# Altium integrated library EFR_Lib.IntLib: 430 symbols (part 6 of 6)
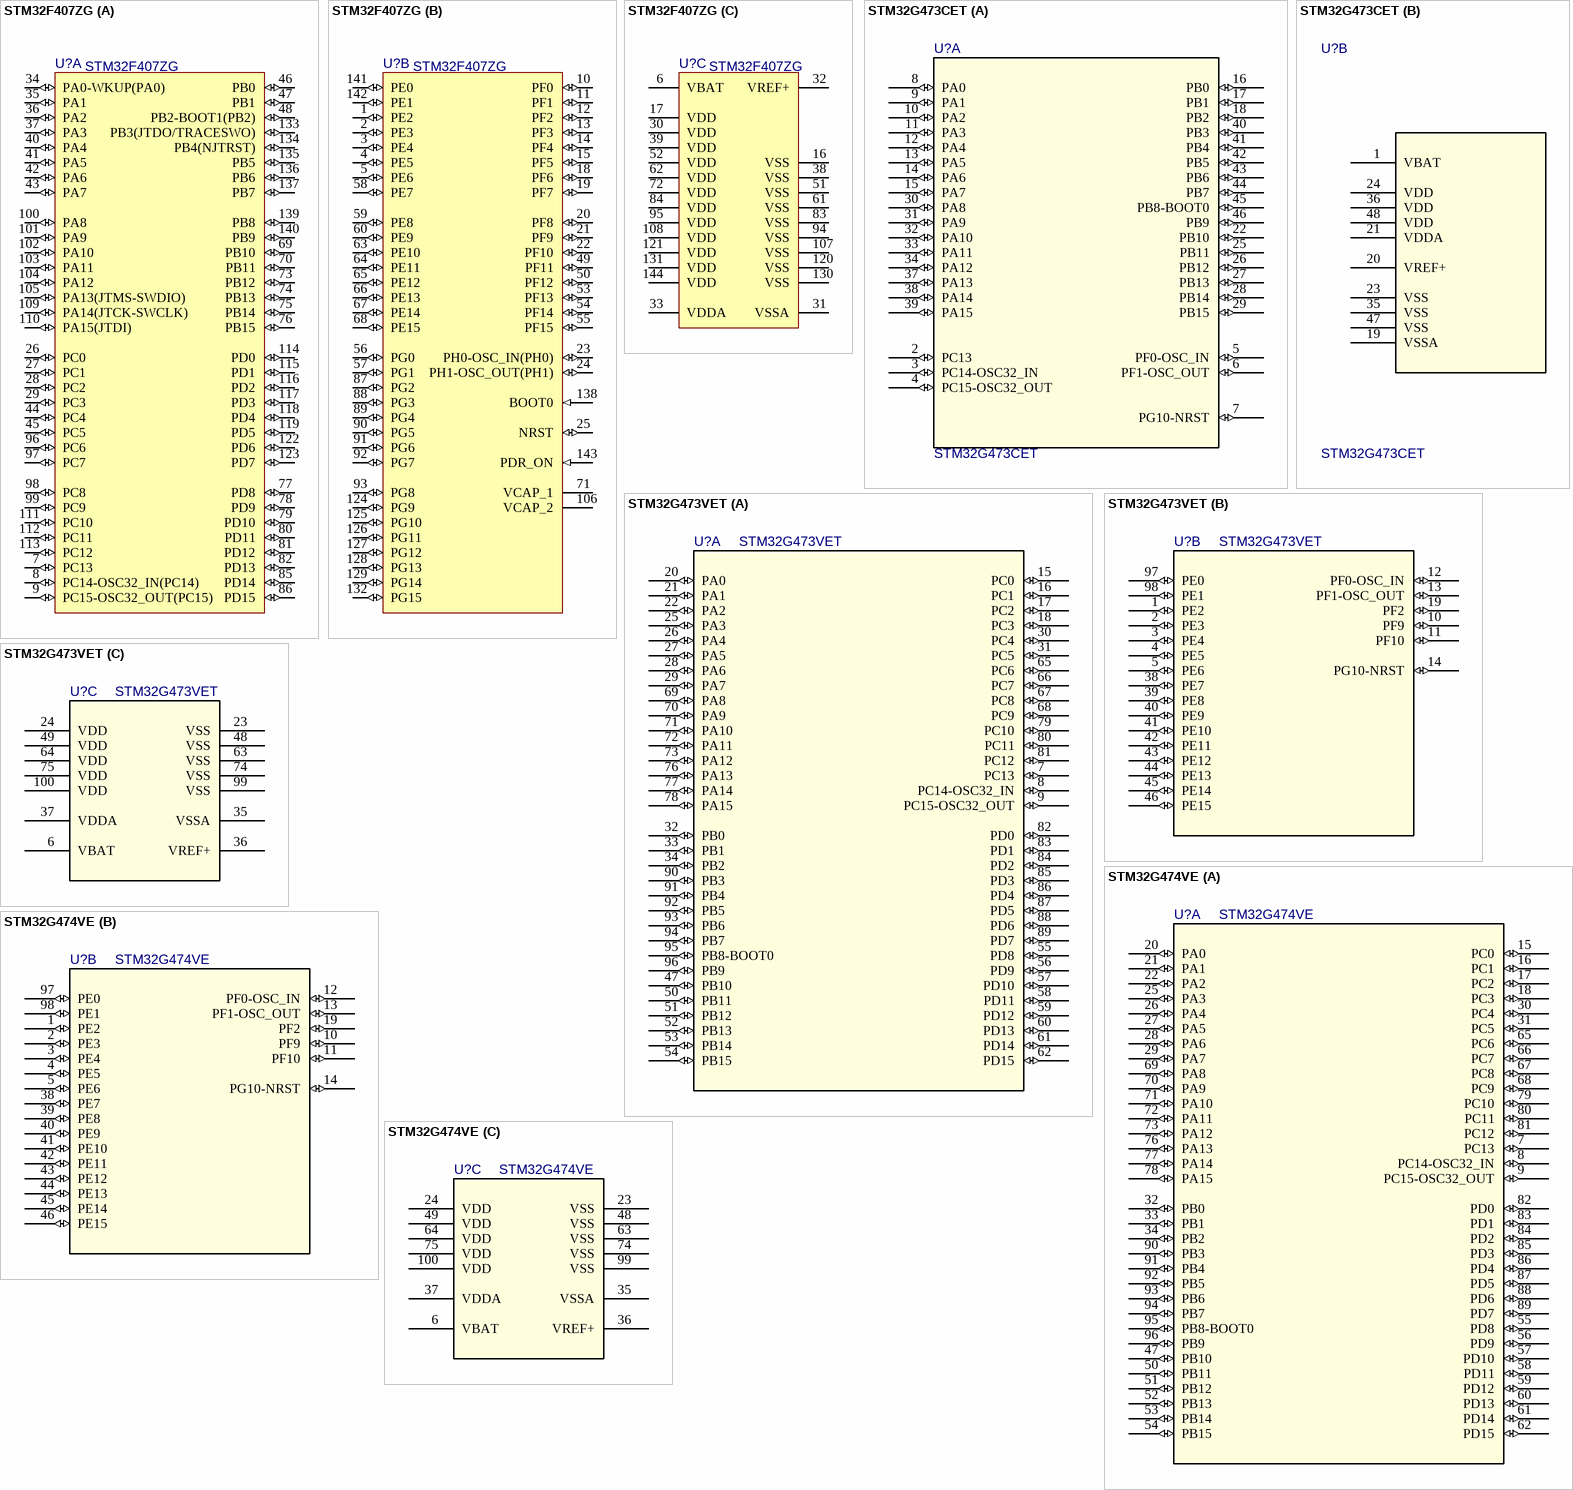
[diagram p34: symbols STM32F407ZG to STM32G474VE]

## STM32G474VE
designator U?
Microcontroller 32-Bit ARM Cortex-M4 RISC 512KB Flash 1.71V to 3.6V 100-Pin LQFP; Manufacturer: STMicroelectronics; Built_By: EMA_UL_Team; SourceLibrary: Updates_to_database_2020-10-19; PartNumber: STM32G474VE; Copyright: Copyright (C) 2018 Accelerated Designs. All rights reserved; RefDes: RefDes; Type: MCU; RoHS: No; Category: Microcontrollers; ComponentLink1Description: Manufacturer; ComponentLink1URL: https://www.st.com/content/st_com/en/products/microcontrollers-microprocessors/stm32-32-bit-arm-cortex-mcus/stm32-mainstream-mcus/stm32g4-series/stm32g4x4/stm32g474ve.html; ComponentLink2Description: Datasheet; ComponentLink2URL: https://www.st.com/resource/en/datasheet/stm32g474ve.pdf; ComponentLink3Description: Reference Manual; ComponentLink3URL: https://www.st.com/resource/en/reference_manual/dm00355726-stm32g4-series-advanced-armbased-32bit-mcus-stmicroelectronics.pdf
footprint LQFP100_L
footprint LQFP100_N
part A pins: 7 PC13 (io), 8 PC14-OSC32_IN (io), 9 PC15-OSC32_OUT (io), 15 PC0 (io), 16 PC1 (io), 17 PC2 (io), 18 PC3 (io), 20 PA0 (io), 21 PA1 (io), 22 PA2 (io), 25 PA3 (io), 26 PA4 (io), 27 PA5 (io), 28 PA6 (io), 29 PA7 (io), 30 PC4 (io), 31 PC5 (io), 32 PB0 (io), 33 PB1 (io), 34 PB2 (io), 47 PB10 (io), 50 PB11 (io), 51 PB12 (io), 52 PB13 (io), 53 PB14 (io), 54 PB15 (io), 55 PD8 (io), 56 PD9 (io), 57 PD10 (io), 58 PD11 (io), 59 PD12 (io), 60 PD13 (io), 61 PD14 (io), 62 PD15 (io), 65 PC6 (io), 66 PC7 (io), 67 PC8 (io), 68 PC9 (io), 69 PA8 (io), 70 PA9 (io), 71 PA10 (io), 72 PA11 (io), 73 PA12 (io), 76 PA13 (io), 77 PA14 (io), 78 PA15 (io), 79 PC10 (io), 80 PC11 (io), 81 PC12 (io), 82 PD0 (io), 83 PD1 (io), 84 PD2 (io), 85 PD3 (io), 86 PD4 (io), 87 PD5 (io), 88 PD6 (io), 89 PD7 (io), 90 PB3 (io), 91 PB4 (io), 92 PB5 (io), 93 PB6 (io), 94 PB7 (io), 95 PB8-BOOT0 (io), 96 PB9 (io)
part B pins: 1 PE2 (io), 2 PE3 (io), 3 PE4 (io), 4 PE5 (io), 5 PE6 (io), 10 PF9 (io), 11 PF10 (io), 12 PF0-OSC_IN (io), 13 PF1-OSC_OUT (io), 14 PG10-NRST (io), 19 PF2 (io), 38 PE7 (io), 39 PE8 (io), 40 PE9 (io), 41 PE10 (io), 42 PE11 (io), 43 PE12 (io), 44 PE13 (io), 45 PE14 (io), 46 PE15 (io), 97 PE0 (io), 98 PE1 (io)
part C pins: 6 VBAT (power), 23 VSS (power), 24 VDD (power), 35 VSSA (power), 36 VREF+ (power), 37 VDDA (power), 48 VSS (power), 49 VDD (power), 63 VSS (power), 64 VDD (power), 74 VSS (power), 75 VDD (power), 99 VSS (power), 100 VDD (power)

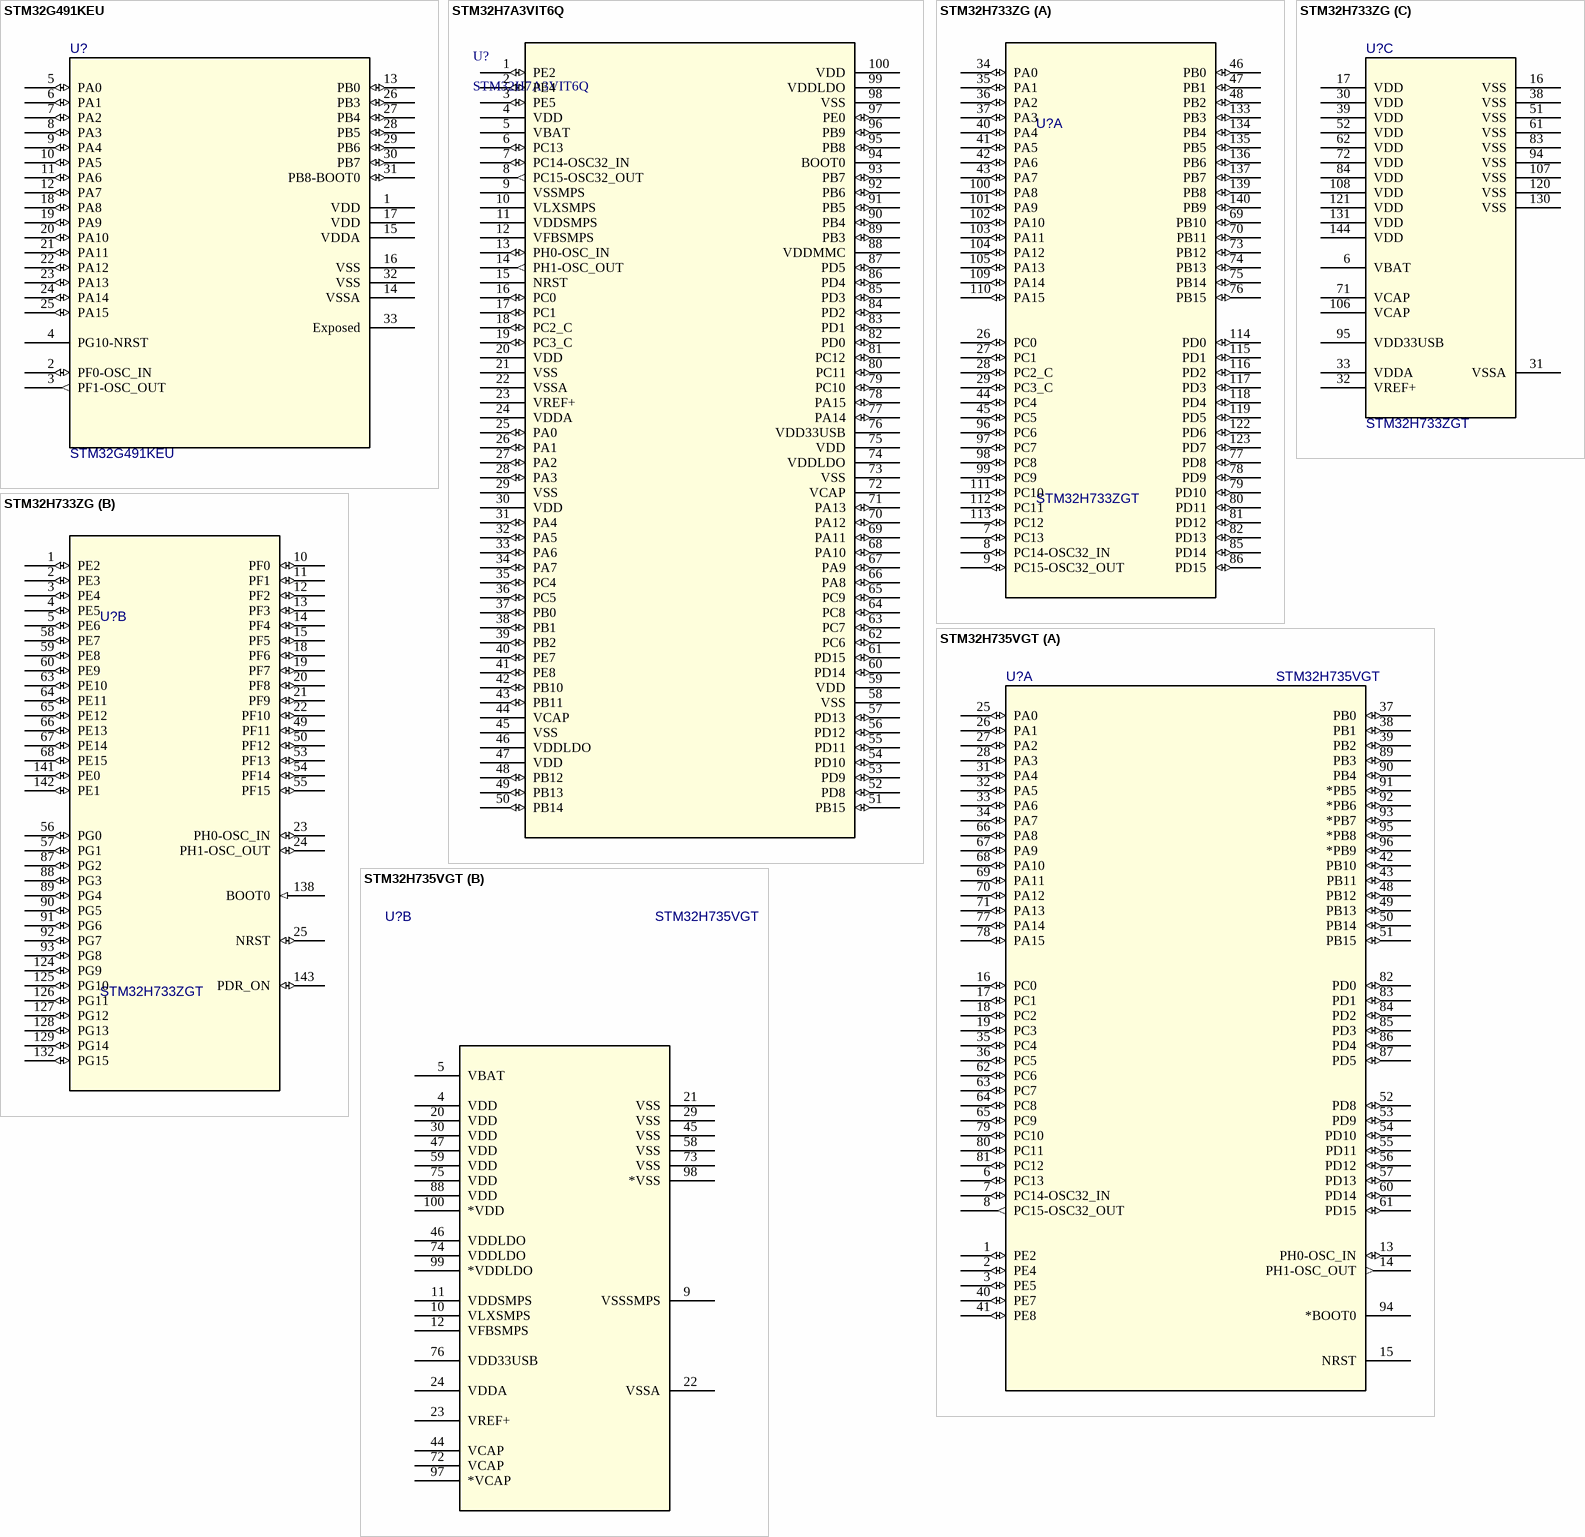
[diagram p24: symbols STM32G491KEU to STM32H735VGT]

## STM32G491KEU
designator U?
Arm Cortex-M4 32-bit MCU+FPU, 170 MHz / 213 DMIPS, / up to 512 KB Flash, 112 KB SRAM, rich analog, math accelerator; PartNumber: STM32G491KEU6; Manufacturer: STMicroelectronics; SourceLibrary: Add_to_database_2021-02-18; Built_By: EMA_Matt; Datasheet: https://www.st.com/resource/en/datasheet/stm32g491cc.pdf; Copyright: Copyright (C) 2018 Accelerated Designs. All rights reserved; RefDes: RefDes; Type: MCU; ComponentLink1Description: Manufacturer; ComponentLink1URL: https://www.st.com/content/st_com/en/products/microcontrollers-microprocessors/stm32-32-bit-arm-cortex-mcus/stm32-mainstream-mcus/stm32g4-series/stm32g4x1/stm32g491ke.html; ComponentLink2Description: Datasheet; ComponentLink2URL: https://www.st.com/resource/en/datasheet/stm32g491ke.pdf; ComponentLink3Description: Reference Manual; ComponentLink3URL: https://www.st.com/resource/en/reference_manual/rm0440-stm32g4-series-advanced-armbased-32bit-mcus-stmicroelectronics.pdf
footprint QFPN32_L (STM)
footprint QFPN32_N (STM)
footprint QFPN32_M (STM)
pins: 1 VDD (power), 2 PF0-OSC_IN (io), 3 PF1-OSC_OUT (out), 4 PG10-NRST, 5 PA0 (io), 6 PA1 (io), 7 PA2 (io), 8 PA3 (io), 9 PA4 (io), 10 PA5 (io), 11 PA6 (io), 12 PA7 (io), 13 PB0 (io), 14 VSSA, 15 VDDA (power), 16 VSS, 17 VDD (power), 18 PA8 (io), 19 PA9 (io), 20 PA10 (io), 21 PA11 (io), 22 PA12 (io), 23 PA13 (io), 24 PA14 (io), 25 PA15 (io), 26 PB3 (io), 27 PB4 (io), 28 PB5 (io), 29 PB6 (io), 30 PB7 (io), 31 PB8-BOOT0 (io), 32 VSS, 33 Exposed

## STM32H7A3VIT6Q
designator U?
No Description Available; Mfr_Name: STMicroelectronics; Copyright: Copyright (C) 2022 Ultra Librarian. All rights reserved.; Manufacturer_Part_Number: STM32H7A3VIT6Q; RefDes: RefDes; Type: DEV
footprint LQFP100
footprint LQFP100-L
footprint LQFP100-M
footprint LQFP100_N
pins: 1 PE2 (io), 2 PE4 (io), 3 PE5 (io), 4 VDD (power), 5 VBAT, 6 PC13 (io), 7 PC14-OSC32_IN (io), 8 PC15-OSC32_OUT (out), 9 VSSMPS, 10 VLXSMPS, 11 VDDSMPS (power), 12 VFBSMPS, 13 PH0-OSC_IN (io), 14 PH1-OSC_OUT (out), 15 NRST, 16 PC0 (io), 17 PC1 (io), 18 PC2_C (io), 19 PC3_C (io), 20 VDD (power), 21 VSS, 22 VSSA, 23 VREF+ (power), 24 VDDA (power), 25 PA0 (io), 26 PA1 (io), 27 PA2 (io), 28 PA3 (io), 29 VSS, 30 VDD (power), 31 PA4 (io), 32 PA5 (io), 33 PA6 (io), 34 PA7 (io), 35 PC4 (io), 36 PC5 (io), 37 PB0 (io), 38 PB1 (io), 39 PB2 (io), 40 PE7 (io), 41 PE8 (io), 42 PB10 (io), 43 PB11 (io), 44 VCAP, 45 VSS, 46 VDDLDO (power), 47 VDD (power), 48 PB12 (io), 49 PB13 (io), 50 PB14 (io), 51 PB15 (io), 52 PD8 (io), 53 PD9 (io), 54 PD10 (io), 55 PD11 (io), 56 PD12 (io), 57 PD13 (io), 58 VSS, 59 VDD (power), 60 PD14 (io), 61 PD15 (io), 62 PC6 (io), 63 PC7 (io), 64 PC8 (io), 65 PC9 (io), 66 PA8 (io), 67 PA9 (io), 68 PA10 (io), 69 PA11 (io), 70 PA12 (io), 71 PA13 (io), 72 VCAP, 73 VSS, 74 VDDLDO (power), 75 VDD (power), 76 VDD33USB (power), 77 PA14 (io), 78 PA15 (io), 79 PC10 (io), 80 PC11 (io), 81 PC12 (io), 82 PD0 (io), 83 PD1 (io), 84 PD2 (io), 85 PD3 (io), 86 PD4 (io), 87 PD5 (io), 88 VDDMMC (power), 89 PB3 (io), 90 PB4 (io), 91 PB5 (io), 92 PB6 (io), 93 PB7 (io), 94 BOOT0, 95 PB8 (io), 96 PB9 (io), 97 PE0 (io), 98 VSS, 99 VDDLDO (power), 100 VDD (power)

## STM32H733ZG
designator U?, comment STM32H733ZGT
32-bit Arm® Cortex®-M7 550 MHz MCU, 1 MB Flash, 564 KB RAM, / 35 comms peripherals and analog interfaces, HW crypto/hash; Manufacturer: STMicroelectronics; PartNumber: STM32H733ZGT6; SourceLibrary: STMicroelectronics_2020-09-22_1; Built_By: EMA_Jessica; Copyright: Copyright (C) 2018 Accelerated Designs. All rights reserved; RefDes: RefDes; Type: DEV; Supplier 1: Arrow Electronics; RoHS: Yes; Stock 1: 151; Pricing 1: 1=10,82500, 10=9,96900, 25=9,32500, 100=8,44700, 250=7,71500, 500=7,63800, 1000=7,56100, 360=10,78000, 3600=10,26000, 36000=7,35500, 180000=6,06900, 360000=6,06200 (USD); Supplier Part Number 1: STM32H733ZGT6
footprint LQFP144_V_STM (Thin QFP, 144-Leads, Body 20x20mm, Pitch 0.5mm, ST Recommended)
footprint LQFP144_L (Thin QFP, 144-Leads, Body 20x20mm, Pitch 0.5mm, IPC High Density)
footprint LQFP144_N (Thin QFP, 144-Leads, Body 20x20mm, Pitch 0.5mm, IPC Medium Density)
footprint LQFP144_M (Thin QFP, 144-Leads, Body 20x20mm, Pitch 0.5mm, IPC Low Density)
part A pins: 7 PC13 (io), 8 PC14-OSC32_IN (io), 9 PC15-OSC32_OUT (io), 26 PC0 (io), 27 PC1 (io), 28 PC2_C (io), 29 PC3_C (io), 34 PA0 (io), 35 PA1 (io), 36 PA2 (io), 37 PA3 (io), 40 PA4 (io), 41 PA5 (io), 42 PA6 (io), 43 PA7 (io), 44 PC4 (io), 45 PC5 (io), 46 PB0 (io), 47 PB1 (io), 48 PB2 (io), 69 PB10 (io), 70 PB11 (io), 73 PB12 (io), 74 PB13 (io), 75 PB14 (io), 76 PB15 (io), 77 PD8 (io), 78 PD9 (io), 79 PD10 (io), 80 PD11 (io), 81 PD12 (io), 82 PD13 (io), 85 PD14 (io), 86 PD15 (io), 96 PC6 (io), 97 PC7 (io), 98 PC8 (io), 99 PC9 (io), 100 PA8 (io), 101 PA9 (io), 102 PA10 (io), 103 PA11 (io), 104 PA12 (io), 105 PA13 (io), 109 PA14 (io), 110 PA15 (io), 111 PC10 (io), 112 PC11 (io), 113 PC12 (io), 114 PD0 (io), 115 PD1 (io), 116 PD2 (io), 117 PD3 (io), 118 PD4 (io), 119 PD5 (io), 122 PD6 (io), 123 PD7 (io), 133 PB3 (io), 134 PB4 (io), 135 PB5 (io), 136 PB6 (io), 137 PB7 (io), 139 PB8 (io), 140 PB9 (io)
part B pins: 1 PE2 (io), 2 PE3 (io), 3 PE4 (io), 4 PE5 (io), 5 PE6 (io), 10 PF0 (io), 11 PF1 (io), 12 PF2 (io), 13 PF3 (io), 14 PF4 (io), 15 PF5 (io), 18 PF6 (io), 19 PF7 (io), 20 PF8 (io), 21 PF9 (io), 22 PF10 (io), 23 PH0-OSC_IN (io), 24 PH1-OSC_OUT (io), 25 NRST (io), 49 PF11 (io), 50 PF12 (io), 53 PF13 (io), 54 PF14 (io), 55 PF15 (io), 56 PG0 (io), 57 PG1 (io), 58 PE7 (io), 59 PE8 (io), 60 PE9 (io), 63 PE10 (io), 64 PE11 (io), 65 PE12 (io), 66 PE13 (io), 67 PE14 (io), 68 PE15 (io), 87 PG2 (io), 88 PG3 (io), 89 PG4 (io), 90 PG5 (io), 91 PG6 (io), 92 PG7 (io), 93 PG8 (io), 124 PG9 (io), 125 PG10 (io), 126 PG11 (io), 127 PG12 (io), 128 PG13 (io), 129 PG14 (io), 132 PG15 (io), 138 BOOT0 (in), 141 PE0 (io), 142 PE1 (io), 143 PDR_ON (io)
part C pins: 6 VBAT (power), 16 VSS (power), 17 VDD (power), 30 VDD (power), 31 VSSA (power), 32 VREF+ (power), 33 VDDA (power), 38 VSS (power), 39 VDD (power), 51 VSS (power), 52 VDD (power), 61 VSS (power), 62 VDD (power), 71 VCAP (power), 72 VDD (power), 83 VSS (power), 84 VDD (power), 94 VSS (power), 95 VDD33USB (power), 106 VCAP (power), 107 VSS (power), 108 VDD (power), 120 VSS (power), 121 VDD (power), 130 VSS (power), 131 VDD (power), 144 VDD (power)

## STM32H735VGT
designator U?
32-bit Arm® Cortex®-M7 550 MHz MCU, 1 MB Flash, 564 KB RAM, / 35 comms peripherals and analog interfaces, HW crypto/hash; PartNumber: STM32H735VGT6; Manufacturer: STMicroelectronics; Type: MCU; ComponentLink1Description: Datasheet; ComponentLink1URL: https://www.st.com/resource/en/datasheet/stm32h735ag.pdf
footprint LQFP100_L
footprint LQFP100_N
part A pins: 1 PE2 (io), 2 PE4 (io), 3 PE5 (io), 6 PC13 (io), 7 PC14-OSC32_IN (io), 8 PC15-OSC32_OUT (out), 13 PH0-OSC_IN (io), 14 PH1-OSC_OUT (out), 15 NRST, 16 PC0 (io), 17 PC1 (io), 18 PC2 (io), 19 PC3 (io), 25 PA0 (io), 26 PA1 (io), 27 PA2 (io), 28 PA3 (io), 31 PA4 (io), 32 PA5 (io), 33 PA6 (io), 34 PA7 (io), 35 PC4 (io), 36 PC5 (io), 37 PB0 (io), 38 PB1 (io), 39 PB2 (io), 40 PE7 (io), 41 PE8 (io), 42 PB10 (io), 43 PB11 (io), 48 PB12 (io), 49 PB13 (io), 50 PB14 (io), 51 PB15 (io), 52 PD8 (io), 53 PD9 (io), 54 PD10 (io), 55 PD11 (io), 56 PD12 (io), 57 PD13 (io), 60 PD14 (io), 61 PD15 (io), 62 PC6 (io), 63 PC7 (io), 64 PC8 (io), 65 PC9 (io), 66 PA8 (io), 67 PA9 (io), 68 PA10 (io), 69 PA11 (io), 70 PA12 (io), 71 PA13 (io), 77 PA14 (io), 78 PA15 (io), 79 PC10 (io), 80 PC11 (io), 81 PC12 (io), 82 PD0 (io), 83 PD1 (io), 84 PD2 (io), 85 PD3 (io), 86 PD4 (io), 87 PD5 (io), 89 PB3 (io), 90 PB4 (io), 91 *PB5 (io), 92 *PB6 (io), 93 *PB7 (io), 94 *BOOT0, 95 *PB8 (io), 96 *PB9 (io)
part B pins: 4 VDD (power), 5 VBAT, 9 VSSSMPS, 10 VLXSMPS, 11 VDDSMPS (power), 12 VFBSMPS, 20 VDD (power), 21 VSS, 22 VSSA, 23 VREF+ (power), 24 VDDA (power), 29 VSS, 30 VDD (power), 44 VCAP, 45 VSS, 46 VDDLDO (power), 47 VDD (power), 58 VSS, 59 VDD (power), 72 VCAP, 73 VSS, 74 VDDLDO (power), 75 VDD (power), 76 VDD33USB (power), 88 VDD (power), 97 *VCAP, 98 *VSS, 99 *VDDLDO (power), 100 *VDD (power)

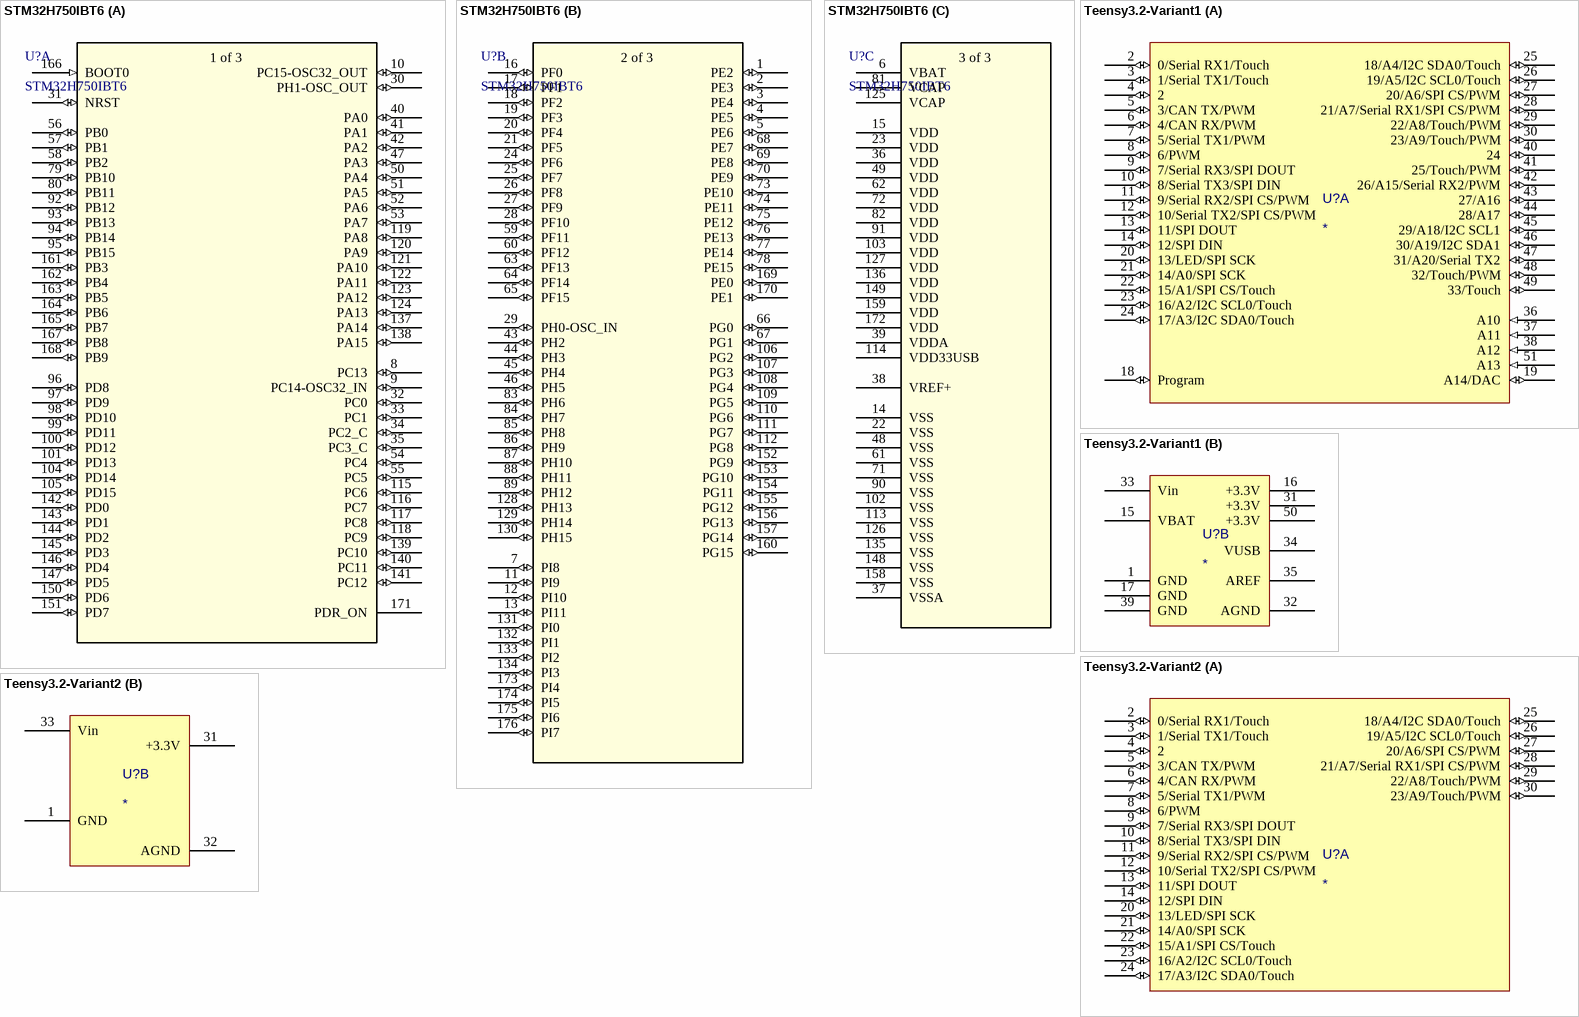
[diagram p25: symbols STM32H750IBT6 to Teensy3.2-Variant2]

## STM32H750IBT6
designator U?
No Description Available; Mfr_Name: STMicroelectronics; Copyright: Copyright (C) 2022 Ultra Librarian. All rights reserved.; Manufacturer_Part_Number: STM32H750IBT6; RefDes: RefDes; Type: DEV
footprint LQFP176_24X24_STM
part A pins: 8 PC13 (io), 9 PC14-OSC32_IN (io), 10 PC15-OSC32_OUT (io), 30 PH1-OSC_OUT (io), 31 NRST (io), 32 PC0 (io), 33 PC1 (io), 34 PC2_C (io), 35 PC3_C (io), 40 PA0 (io), 41 PA1 (io), 42 PA2 (io), 47 PA3 (io), 50 PA4 (io), 51 PA5 (io), 52 PA6 (io), 53 PA7 (io), 54 PC4 (io), 55 PC5 (io), 56 PB0 (io), 57 PB1 (io), 58 PB2 (io), 79 PB10 (io), 80 PB11 (io), 92 PB12 (io), 93 PB13 (io), 94 PB14 (io), 95 PB15 (io), 96 PD8 (io), 97 PD9 (io), 98 PD10 (io), 99 PD11 (io), 100 PD12 (io), 101 PD13 (io), 104 PD14 (io), 105 PD15 (io), 115 PC6 (io), 116 PC7 (io), 117 PC8 (io), 118 PC9 (io), 119 PA8 (io), 120 PA9 (io), 121 PA10 (io), 122 PA11 (io), 123 PA12 (io), 124 PA13 (io), 137 PA14 (io), 138 PA15 (io), 139 PC10 (io), 140 PC11 (io), 141 PC12 (io), 142 PD0 (io), 143 PD1 (io), 144 PD2 (io), 145 PD3 (io), 146 PD4 (io), 147 PD5 (io), 150 PD6 (io), 151 PD7 (io), 161 PB3 (io), 162 PB4 (io), 163 PB5 (io), 164 PB6 (io), 165 PB7 (io), 166 BOOT0 (in), 167 PB8 (io), 168 PB9 (io), 171 PDR_ON
part B pins: 1 PE2 (io), 2 PE3 (io), 3 PE4 (io), 4 PE5 (io), 5 PE6 (io), 7 PI8 (io), 11 PI9 (io), 12 PI10 (io), 13 PI11 (io), 16 PF0 (io), 17 PF1 (io), 18 PF2 (io), 19 PF3 (io), 20 PF4 (io), 21 PF5 (io), 24 PF6 (io), 25 PF7 (io), 26 PF8 (io), 27 PF9 (io), 28 PF10 (io), 29 PH0-OSC_IN (io), 43 PH2 (io), 44 PH3 (io), 45 PH4 (io), 46 PH5 (io), 59 PF11 (io), 60 PF12 (io), 63 PF13 (io), 64 PF14 (io), 65 PF15 (io), 66 PG0 (io), 67 PG1 (io), 68 PE7 (io), 69 PE8 (io), 70 PE9 (io), 73 PE10 (io), 74 PE11 (io), 75 PE12 (io), 76 PE13 (io), 77 PE14 (io), 78 PE15 (io), 83 PH6 (io), 84 PH7 (io), 85 PH8 (io), 86 PH9 (io), 87 PH10 (io), 88 PH11 (io), 89 PH12 (io), 106 PG2 (io), 107 PG3 (io), 108 PG4 (io), 109 PG5 (io), 110 PG6 (io), 111 PG7 (io), 112 PG8 (io), 128 PH13 (io), 129 PH14 (io), 130 PH15 (io), 131 PI0 (io), 132 PI1 (io), 133 PI2 (io), 134 PI3 (io), 152 PG9 (io), 153 PG10 (io), 154 PG11 (io), 155 PG12 (io), 156 PG13 (io), 157 PG14 (io), 160 PG15 (io), 169 PE0 (io), 170 PE1 (io), 173 PI4 (io), 174 PI5 (io), 175 PI6 (io), 176 PI7 (io)
part C pins: 6 VBAT (power), 14 VSS (power), 15 VDD (power), 22 VSS (power), 23 VDD (power), 36 VDD (power), 37 VSSA (power), 38 VREF+ (power), 39 VDDA (power), 48 VSS (power), 49 VDD (power), 61 VSS (power), 62 VDD (power), 71 VSS (power), 72 VDD (power), 81 VCAP (power), 82 VDD (power), 90 VSS (power), 91 VDD (power), 102 VSS (power), 103 VDD (power), 113 VSS (power), 114 VDD33USB (power), 125 VCAP (power), 126 VSS (power), 127 VDD (power), 135 VSS (power), 136 VDD (power), 148 VSS (power), 149 VDD (power), 158 VSS (power), 159 VDD (power), 172 VDD (power)
part A text: 1 of 3
part B text: 2 of 3
part C text: 3 of 3

## Teensy3.2-Variant1
designator U?
All Pins without Reset and Clock; PartNumber: Teensy3.2; Manufacturer: PJRC; ComponentLink1Description: Manufacturer; ComponentLink1URL: https://www.pjrc.com/teensy/
footprint Teensy3.2-Variant1
part A pins: 2 0/Serial RX1/Touch (io), 3 1/Serial TX1/Touch (io), 4 2 (io), 5 3/CAN TX/PWM (io), 6 4/CAN RX/PWM (io), 7 5/Serial TX1/PWM (io), 8 6/PWM (io), 9 7/Serial RX3/SPI DOUT (io), 10 8/Serial TX3/SPI DIN (io), 11 9/Serial RX2/SPI CS/PWM (io), 12 10/Serial TX2/SPI CS/PWM (io), 13 11/SPI DOUT (io), 14 12/SPI DIN (io), 18 Program (io), 19 A14/DAC (io), 20 13/LED/SPI SCK (io), 21 14/A0/SPI SCK (io), 22 15/A1/SPI CS/Touch (io), 23 16/A2/I2C SCL0/Touch (io), 24 17/A3/I2C SDA0/Touch (io), 25 18/A4/I2C SDA0/Touch (io), 26 19/A5/I2C SCL0/Touch (io), 27 20/A6/SPI CS/PWM (io), 28 21/A7/Serial RX1/SPI CS/PWM (io), 29 22/A8/Touch/PWM (io), 30 23/A9/Touch/PWM (io), 36 A10 (in), 37 A11 (in), 38 A12 (in), 40 24 (io), 41 25/Touch/PWM (io), 42 26/A15/Serial RX2/PWM (io), 43 27/A16 (io), 44 28/A17 (io), 45 29/A18/I2C SCL1 (io), 46 30/A19/I2C SDA1 (io), 47 31/A20/Serial TX2 (io), 48 32/Touch/PWM (io), 49 33/Touch (io), 51 A13 (in)
part B pins: 1 GND (power), 15 VBAT (power), 16 +3.3V (power), 17 GND (power), 31 +3.3V (power), 32 AGND (power), 33 Vin (power), 34 VUSB (power), 35 AREF (power), 39 GND (power), 50 +3.3V (power)

## Teensy3.2-Variant2
designator U?
All Pins only two pin row header; PartNumber: Teensy3.2; Manufacturer: PJRC; ComponentLink1Description: Manufacturer; ComponentLink1URL: https://www.pjrc.com/teensy/
footprint Teensy3.2-Variant2_THT
footprint Teensy3.2-Variant2_SMD
part A pins: 2 0/Serial RX1/Touch (io), 3 1/Serial TX1/Touch (io), 4 2 (io), 5 3/CAN TX/PWM (io), 6 4/CAN RX/PWM (io), 7 5/Serial TX1/PWM (io), 8 6/PWM (io), 9 7/Serial RX3/SPI DOUT (io), 10 8/Serial TX3/SPI DIN (io), 11 9/Serial RX2/SPI CS/PWM (io), 12 10/Serial TX2/SPI CS/PWM (io), 13 11/SPI DOUT (io), 14 12/SPI DIN (io), 20 13/LED/SPI SCK (io), 21 14/A0/SPI SCK (io), 22 15/A1/SPI CS/Touch (io), 23 16/A2/I2C SCL0/Touch (io), 24 17/A3/I2C SDA0/Touch (io), 25 18/A4/I2C SDA0/Touch (io), 26 19/A5/I2C SCL0/Touch (io), 27 20/A6/SPI CS/PWM (io), 28 21/A7/Serial RX1/SPI CS/PWM (io), 29 22/A8/Touch/PWM (io), 30 23/A9/Touch/PWM (io)
part B pins: 1 GND (power), 31 +3.3V (power), 32 AGND (power), 33 Vin (power)


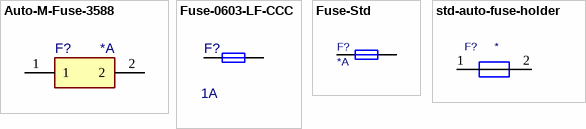
[diagram p26: symbols Auto-M-Fuse-3588 to std-auto-fuse-holder]

## Auto-M-Fuse-3588
designator F?  Current (A): *A  (hidden comment: *)
Fuse Holder SMT MINI FUSE HOLDER .630 X .290 / & LittleFuse 0297xxx; Manufacturer_Name: Keystone Electronics; Manufacturer Part Number: 3588; Current Rating: 20A; Voltage Rating (AC): 500; ComponentLink1Description: Datasheet; ComponentLink1URL: https://www.keyelco.com/product-pdf.cfm?p=311; ComponentLink2Description: Datasheet-2; ComponentLink2URL: https://www.littelfuse.com/assetdocs/littelfuse-datasheet-297-mini32v?assetguid=42c9dd21-a88e-4328-8e67-2f832444faf1; Part Number: 0297xxx
footprint 3588
pins: 1, 2

## Fuse-0603-LF-CCC
designator F?, comment value 1A  (hidden comment: Fuse)
0603 Size Lead-Free, Halogen Free, High Temperature Very Fast-Acting Ceramic Fuse, 438 Series; Manufacturer: Littelfuse; PartNumber: 0438001.WR; Voltage Rating (AC): 32V; DC Cold Resistance: 310mR; Fuse Type: Board Mount (Cartridge Style Excluded); Voltage Rating: 63V; Power Dissipation: 351mW; Approvals: UL,CSA; Voltage (V): *; Tolerance: *; Capacitance: *; Type: Fuse; Power (W): *; Resistance: *; Current (A): 1A; ComponentLink1Description: Manufacturer; ComponentLink1URL: https://www.littelfuse.com/products/fuses/surface-mount-fuses/thin-film-chip-fuses/438.aspx; ComponentLink2Description: Datasheet; ComponentLink2URL: https://www.littelfuse.com/media?resourcetype=datasheets&itemid=9877a1b8-2231-4682-bbef-54e2bfd4d482&filename=littelfuse-fuse-438-datasheet; Supplier 1: Mouser; Manufacturer Part Number: 0438001.WR; RoHS: Yes; Category: Fuses; Stock 1: 11641; Pricing 1: 1=1,32000, 10=1,02000, 50=1,02000, 100=0,84600, 1000=0,61300, 10000=0,55900 (USD); Mount: Surface Mount; Case/Package: 0603; Number of Pins: 2; Case Code (Metric): 1608; Case Code (Imperial): 0603; Body Material: Ceramic; Housing Material: Ceramic; Terminal Material: Nickel; Min Operating Temperature: -55°C; Max Operating Temperature: 150°C; Current Rating: 1A; Voltage Rating (DC): 32V; Packaging: Tape and Reel; Package Quantity: 3000; Working Voltage: 32V; Fuse Current: 1A; Series: 438; Length: 1.54mm; Width: 0.85mm; Height: 0.502mm; Depth: 0.85mm; Radiation Hardening: No; Reach SVHC Compliant: Yes; Lead Free: Lead Free; RoHS Compliant: Yes; Supplier 2: RSComponents; Supplier 3: Arrow Electronics; Supplier Part Number 3: 0438001.WR; Supplier Part Number 2: 8207105; Supplier Part Number 1: 576-0438001.WR
footprint Fuse_0603(1608)_CCC (Chip Fuse for CCC, 2-Leads, Body 1.60x0.85mm, IPC Low Density)
pins: 1, 2

## Fuse-Std
designator F?, comment value *A  (hidden comment: Fuse)
Manufacturer: *; Voltage (V): *; Tolerance: *; Capacitance: *; Type: Fuse; Power (W): *; Resistance: *; Manufacturer P/N: *; Current (A): *A
footprint 0SPF002.HXR (2A 1000V Fuse)
footprint LF_0154
footprint 0527040.UXTHP (40A 500V)
footprint 1350HV
pins: 1, 2

## std-auto-fuse-holder
designator F?
std tht automotive fuse holder; Current (A): *; Voltage (V): *
footprint 3557-2
footprint H18102X4
pins: 1, 2


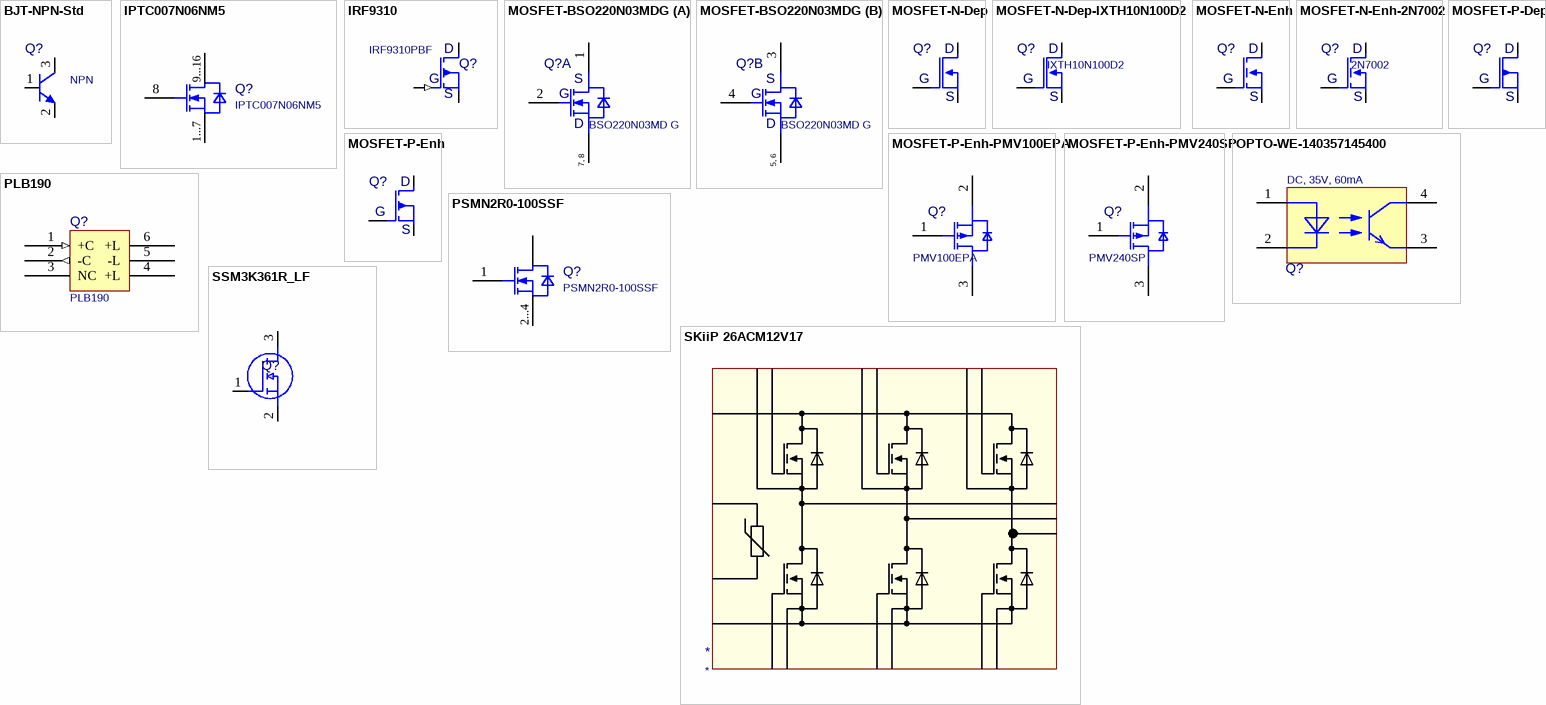
[diagram p27: symbols BJT-NPN-Std to SSM3K361R_LF]

## BJT-NPN-Std
designator Q?, comment NPN
General Purpose Transistor, NPN Silicon, 3-Pin; fT Min (MHz): *; Package: *; IC Continuous (A): *; Polarity: NPN; Manufacturer: *; PartNumber: *
footprint SOT23 (generischer SOT23 Footpint)
pins: 1 B, 2 E, 3 C

## IPTC007N06NM5
designator Q?
Insulated-Gate Field-Effect Transistor (IGFET), N-Channel, Enhancement, Body Diode, Pin 1 Source, 2 Source, 3 Source , 4 Source, 5 Source, 6 Source, 7 Source, 8 Gate, 9 Drain, 10 Drain, 11 Drain, 12 Drain, 13 Drain, 14 Drain, 15 Drain, 16 Drain, 16 Pins; Manufacturer: Infineon Technologies; Package Reference: PG-HDSOP-16-2; Manufacturer Order Number: IPTC007N06NM5
footprint SOIC120P1500X235-16N-1-V (SOIC,1.20mm pitch;16 pin,10.15mm W X 9.90mm L X 2.35mm H body)
pins: 1 SOURCE1, 2 SOURCE2, 3 SOURCE3, 4 SOURCE4, 5 SOURCE5, 6 SOURCE6, 7 SOURCE7, 8 GATE, 9 DRAIN1, 10 DRAIN2, 11 DRAIN3, 12 DRAIN4, 13 DRAIN5, 14 DRAIN6, 15 DRAIN7, 16 DRAIN8
text: 9...16; 1...7

## IRF9310
designator Q?, comment IRF9310PBF
Power MOSFET; Manufacturer: Infineon; Polarity: P-Channel; PinNumber: 8; ComponentLink1Description: Datasheet; ComponentLink1URL: https://www.infineon.com/dgdl/irf9310pbf-1.pdf?fileId=5546d462533600a40153561114d81d97; ComponentLink2Description: Hersteller; ComponentLink2URL: https://www.infineon.com/cms/de/product/power/mosfet/20v-250v-p-channel-power-mosfet/irf9310pbf-1/; PartNumber: IRF9310PBF
footprint SOIC-08
pins: 1 S, 2 S, 3 S, 4 G (in), 5 D, 6 D, 7 D, 8 D

## MOSFET-BSO220N03MDG
designator Q?, comment BSO220N03MD G
OptiMOS 3 M-Series Power-MOSFET, 30V; Manufacturer: Infineon Technologies; Manufacturer P/N: BSO220N03MD G; PackageReference: PG-DSO-8-40; ComponentLink1Description: Datasheet; ComponentLink1URL: https://www.infineon.com/dgdl/BSO220N03MD_rev1.1.pdf?fileId=db3a30431b0626df011b0d922ec17e5c; ComponentLink2Description: Manufacturer; ComponentLink2URL: https://www.infineon.com/cms/en/product/power/mosfet/12v-300v-n-channel-power-mosfet/bso220n03md-g
footprint PG-DSO-8-16_L (SOP, 8-Leads, Body 4.9x3.9mm, Pitch 1.27mm, IPC High Density)
footprint PG-DSO-8-40-V (SOIC,1.27mm pitch;8 pin,3.90mm W X 4.90mm L X 1.75mm H body)
footprint PG-DSO-8-16_N (SOP, 8-Leads, Body 4.9x3.9mm, Pitch 1.27mm, IPC Medium Density)
footprint PG-DSO-8-16_M (SOP, 8-Leads, Body 4.9x3.9mm, Pitch 1.27mm, IPC Low Density)
part A pins: 1 SOURCE1, 2 GATE1, 7 DRAIN1, 8 DRAIN1
part B pins: 3 SOURCE2, 4 GATE2, 5 DRAIN2, 6 DRAIN2
part A text: S; G; D; 7, 8
part B text: S; G; D; 5, 6

## MOSFET-N-Dep
designator Q?
n channel MOSFET, depletion type, bulk connected to source; Manufacturer P/N: xxxx; Pin Number: 3; Manufacturer: *
footprint TO-247
footprint SOT23 (generischer SOT23 Footpint)
pins: 1 G, 2 S, 3 D

## MOSFET-N-Dep-IXTH10N100D2
designator Q?, comment IXTH10N100D2
N Channel MOSFET, depletion type; Manufacturer: Littlefuse; Pin Number: 3; Manufacturer P/N: IXTH10N100D2
footprint TO-247
pins: 1 G, 2 D, 3 S

## MOSFET-N-Enh
designator Q?
n channel MOSFET, enhancement type, bulk connected to source; Manufacturer P/N: xxxx; Pin Number: 3; Manufacturer: *
footprint TO-247
footprint SOT23 (generischer SOT23 Footpint)
pins: 1 G, 2 S, 3 D

## MOSFET-N-Enh-2N7002
designator Q?, comment 2N7002
n channel MOSFET, enhancement type, bulk connected to source / 60 V, 300 mA; Manufacturer: Nexperia; Pin Number: 3; ComponentLink1Description: Manufacturer; ComponentLink1URL: https://www.nexperia.com/products/mosfets/small-signal-mosfets/2N7002.html; ComponentLink2Description: Datasheet; ComponentLink2URL: https://assets.nexperia.com/documents/data-sheet/2N7002.pdf; Supplier 1: Mouser; Supplier Part Number 1: 771-2N7002P-215; Manufacturer P/N: 2N7002
footprint SOT23 (generischer SOT23 Footpint)
pins: 1 G, 2 S, 3 D

## MOSFET-P-Dep
designator Q?
p channel MOSFET, depletion type, bulk connected to source; Pin Number: 3; Manufacturer: *; Manufacturer P/N: *
footprint TO-247
footprint SOT23 (generischer SOT23 Footpint)
pins: 1 G, 2 S, 3 D

## MOSFET-P-Enh
designator Q?
p channel MOSFET, enhancement type, bulk connected to source; Pin Number: 3; Manufacturer: *; Manufacturer P/N: *
footprint TO-247
footprint SOT23 (generischer SOT23 Footpint)
simulation model PMOSFET_Level1 (Model Description)
pins: 1 G, 2 S, 3 D

## MOSFET-P-Enh-PMV100EPA
designator Q?, comment PMV100EPA
60 V, +-20Vgs, P-channel Trench MOSFET SOT23; Manufacturer: Nexperia; Pin Number: 3; Manufacturer P/N: PMV100EPA; Mounting Technology: SMT; Supplier 1: Mouser; Supplier Part Number 1: 771-PMV100EPAR; Supplier 2: Digikey; Supplier Part Number 2: 1727-PMV100EPARCT-ND; ComponentLink1Description: Website; ComponentLink1URL: https://www.nexperia.com/products/mosfets/small-signal-mosfets/PMV100EPA.html; ComponentLink2Description: Datasheet; ComponentLink2URL: https://assets.nexperia.com/documents/data-sheet/PMV100EPA.pdf
footprint SOT23 (generischer SOT23 Footpint)
pins: 1 G, 2 S, 3 D

## MOSFET-P-Enh-PMV240SP
designator Q?, comment PMV240SP
100 V, +-25Vgs, P-channel Trench MOSFET SOT23; Manufacturer: Nexperia; Pin Number: 3; Manufacturer P/N: PMV240SP; Mounting Technology: SMT; Supplier 1: Mouser; Supplier Part Number 1: 771-PMV240SPR; Supplier 2: Digikey; Supplier Part Number 2: 1727-PMV240SPRCT-ND; ComponentLink1Description: Website; ComponentLink1URL: https://www.nexperia.com/products/mosfets/small-signal-mosfets/PMV240SP.html; ComponentLink2Description: Datasheet; ComponentLink2URL: https://assets.nexperia.com/documents/data-sheet/PMV240SP.pdf
footprint SOT23 (generischer SOT23 Footpint)
pins: 1 G, 2 S, 3 D

## OPTO-WE-140357145400
designator Q?, comment DC, 35V, 60mA
WL-OCPT Optocoupler Phototransistor, SOP4, 1 Channel, DC, 35V, 60mA; PartNumber: 140357145400; Manufacturer: Wurth Elektronik; Current Transfer Ratio Max: 600%; Current Transfer Ratio Min: 300%; Isolation Voltage: 3750Vrms; Number of Channels: 1; Category: Optocoupler Phototransistor; Match Code: WL-OCPT; ComponentLink1Description: Website Link; ComponentLink1URL: https://www.we-online.com/redexpert/article/140357145400?ad; ComponentLink2Description: Datasheet Link; ComponentLink2URL: https://www.we-online.com/redexpert/spec/140357145400?ad; Mount: Surface Mount; Operating Temperature Max: 110°C; Operating Temperature Min: -55°C; Packaging: Tape and Reel; Case/Size Code: SOP4; Length: 7mm; Width: 3.6mm; Height: 2.1mm; Collector Emitter Voltage: 35V; Forward Current: 60mA; Input: DC
footprint WL-OCPT_SOP4
simulation model Series_357_140357145400
pins: 1 Anode, 2 Cathode, 3 Emitter, 4 Collector

## PLB190
designator Q?
Single-Pole, Normally Closed OptoMOS® Relay; Manufacturer: IXYS; ComponentLink1Description: Datasheet; ComponentLink1URL: http://www.ixysic.com/home/pdfs.nsf/www/PLB190.pdf/$file/PLB190.pdf; PartNumber: PLB190
footprint IXYS_PLB190
footprint IXYS_PLB190S
pins: 1 +C (in), 2 -C (out), 3 NC, 4 +L (power), 5 -L (power), 6 +L (power)

## PSMN2R0-100SSF
designator Q?  PartNumber: PSMN2R0-100SSF  (hidden comment: *)
footprint PSMN
pins: 1 GATE, 2 SOURCE1, 3 SOURCE2, 4 SOURCE3, 5 DRAIN
text: 2...4

## SKiiP 26ACM12V17
designator *
footprint SKiiP 26ACM12V17
pins: 1 DC-, 2 DC+, 3 S1, 4 G1, 5 S3, 6 G3, 7 S5, 8 G5, 9 G2, 10 S2, 11 G4, 12 S4, 13 G6, 14 S6, 15 U, 16 V, 17 W, 18 PTC+, 19 PTC-

## SSM3K361R_LF
designator Q?
Silicon N-channel MOS Power Management Switches DC-DC Converters; Manufacturer_Name: Toshiba; Manufacturer_Part_Number: SSM3K361R,LF; Geometry.Height: 0.88mm; Mouser Part Number: 757-SSM3K361RLF; Mouser Price/Stock: https://www.mouser.co.uk/ProductDetail/Toshiba/SSM3K361RLF?qs=kdd6aVn74hzchJRi%252BUbybA%3D%3D; Arrow Part Number: SSM3K361R,LF; Arrow Price/Stock: https://www.arrow.com/en/products/ssm3k361rlf/toshiba; Mouser Testing Part Number: *; Mouser Testing Price/Stock: *; Datasheet Link: http://toshiba.semicon-storage.com/info/docget.jsp?did=36685&prodName=SSM3K361R
footprint SOT95P240X88-3N
pins: 1 G, 2 S, 3 D


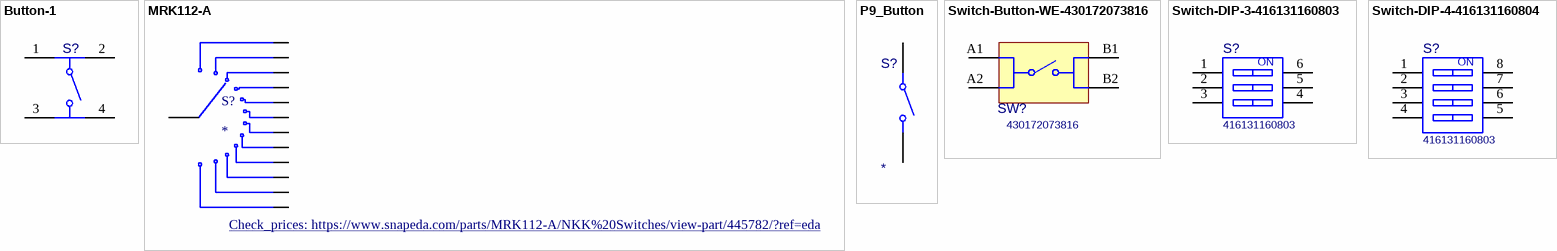
[diagram p28: symbols Button-1 to Switch-DIP-4-416131160804]

## Button-1
designator S?
Button; PartNumber: 430181038816; Manufacturer: Wurth Elektronik; Operation Force: 160gf; Rated Voltage: 12VDC; Rated Current: 50mA; Washable: No; Operating Temperature: -40 to +85degC; Published Date: September 2019; Contact Material: Stainless Steel; Height: 3.8mm; Mounting Technology: SMT; Contact Plating: Silver; Packaging: Tape and Reel; Terminal Material: Copper Alloy; Terminal Plating: Silver
footprint WE-SWT-430181038816 (Tact Switch, SMD, body 4.5x4.5mm)
pins: 1, 2, 3, 4

## MRK112-A
designator S?
Rotary Switch 2 ~ 12 Position SP12T 0.4VA (AC/DC) 28VAC Panel Mount, Through Hole; MF: NKK Switches; MP: MRK112-A; Package: None; Purchase-URL: https://pricing.snapeda.com/search/part/MRK112-A/?ref=eda; Value: *; Price: None; Availability: Warning; SnapEDA_Link: https://www.snapeda.com/parts/MRK112-A/NKK%20Switches/view-part/445782/?ref=snap; Check_prices: https://www.snapeda.com/parts/MRK112-A/NKK%20Switches/view-part/445782/?ref=eda
footprint SW_MRK112-A
pins: 1, 2, 3, 4, 5, 6, 7, 8, 9, 10, 11, 12, A

## P9_Button
designator S?
footprint P9_Button
pins: 1, 2

## Switch-Button-WE-430172073816
designator SW?, comment 430172073816
WS-TASV SMT Tact Switch, L12 x W12 x H7.3mm, 160g, SPST-NO, 12V, 50mA; Manufacturer: Wurth Elektronik; Washable: No; Manufacturer P/N: 430172073816; Category: Tact Switches; Series: WS-TASV; ComponentLink1Description: Website Link; ComponentLink1URL: https://www.we-online.com/redexpert/article/430172073816?ad; ComponentLink2Description: Datasheet Link; ComponentLink2URL: https://www.we-online.com/redexpert/spec/430172073816?ad; Mounting Technology: SMT; Operating Temperature Max: 85°C; Operating Temperature Min: -40°C; Packaging: Tape and Reel; Length (mm): 12; Width (mm): 12; Height (mm): 7.3; Circuit: SPST-NO; Contact Material: Stainless Steel; Contact Plating: Silver; Operation Force: 160g; Rated Current: 50mA; Voltage (V): 12V; Terminal Material: Copper Alloy; Terminal Plating: Silver
footprint WS-TASV_L12W12H7.3_4301x20738x6
pins: A1, A2, B1, B2

## Switch-DIP-3-416131160803
designator S?, comment 416131160803
WS-DISV Small Compact SMD Dip Switch, Flat Actuator with Top Tape, pitch 1.27mm, 3p; Manufacturer: Wurth Elektronik; Operation Force: 500g; Pole Number: 3; Actuator Type: Flat Type; Circuit: SPST-NO; Rated Current Switching: 25mA; Rated Current Non-Switching: 100mA; Rated Voltage Non-Switching: 50VDC; Rated Voltage Switching: 24VDC; ComponentLink1Description: Manufacturer; ComponentLink1URL: http://www.we-online.de; ComponentLink2Description: Datasheet; ComponentLink2URL: https://katalog.we-online.com/em/datasheet/416131160803.pdf; Pitch: 1.27mm; Contact Material: Copper Alloy; Mounting Technology: SMT; Operating Temperature: -40 to +85degC; Contact Plating: Gold; Packaging: Tape and Reel; PartNumber: 416131160803; Published Date: September 2019
footprint Switch-WE-416131160803 (SMD Dip Switch, Small Compact, Raised Actuator, 3pin)
pins: 1, 2, 3, 4, 5, 6
text: ON

## Switch-DIP-4-416131160804
designator S?, comment 416131160803
WS-DISV Small Compact SMD Dip Switch, Flat Actuator with Top Tape, pitch 1.27mm, 4p; PartNumber: 416131160804; Manufacturer: Wurth Elektronik; Operation Force: 500g; Pole Number: 4; Actuator Type: Flat Type; Circuit: SPST-NO; Rated Current Switching: 25mA; Rated Current Non-Switching: 100mA; Rated Voltage Non-Switching: 50VDC; Rated Voltage Switching: 24VDC; ComponentLink1Description: Manufacturer; ComponentLink1URL: http://www.we-online.de; ComponentLink2Description: Datasheet; ComponentLink2URL: https://katalog.we-online.com/em/datasheet/416131160804.pdf; Pitch: 1.27mm; Contact Material: Copper Alloy; Mounting Technology: SMT; Operating Temperature: -40 to +85degC; Contact Plating: Gold; Packaging: Tape and Reel; Published Date: September 2019
footprint Switch-WE-416131160804 (SMD Dip Switch, Small Compact, Raised Actuator, 4pin)
pins: 1, 2, 3, 4, 5, 6, 7, 8
text: ON


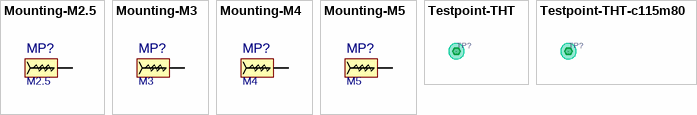
[diagram p29: symbols Mounting-M2.5 to Testpoint-THT-c115m80]

## Mounting-M2.5
designator MP?, comment M2.5  (no BOM)
Mounting Pad M2.5
footprint MISC-SCREW-M2.5 (Mounting hol for M2.5 screw)
pins: 1

## Mounting-M3
designator MP?, comment M3  (no BOM)
Mounting Pad M3
footprint MISC-SCREW-M3.0 (Mounting hol for M3 screw)
pins: 1

## Mounting-M4
designator MP?, comment M4  (no BOM)
Mounting Pad M4
footprint MISC-SCREW-M4.0 (Mounting hol for M4 screw)
pins: 1

## Mounting-M5
designator MP?, comment M5  (no BOM)
Mounting Pad M5
footprint MISC-SCREW-M5.0 (Mounting hol for M5 screw)
pins: 1

## Testpoint-THT
designator TP?, comment TP  (value not drawn)  (no BOM)
Testpoint
footprint MISC-Testpoint-1MM-0.5MM (Testpoint only for testing)
pins: 1

## Testpoint-THT-c115m80
designator TP?  (no BOM)
Testpoint
footprint MISC-Testpoint-c115m80 (Testpoint only for testing. Suitable for 2.00mm pin header)
pins: 1